# Altium footprint library UWRT_Footprint_Library_2020.PcbLib: 376 footprints (part 13 of 24)
Each footprint in its own frame and in the unit in brackets; x right, y up, seen from the top. Pads: shape width x height; smd on the part's side, far side on the other; paste and mask are expansions set on the pad; w line width, h text height; cw(c..) or ccw(c..) is an arc to the next point about the centre after c.
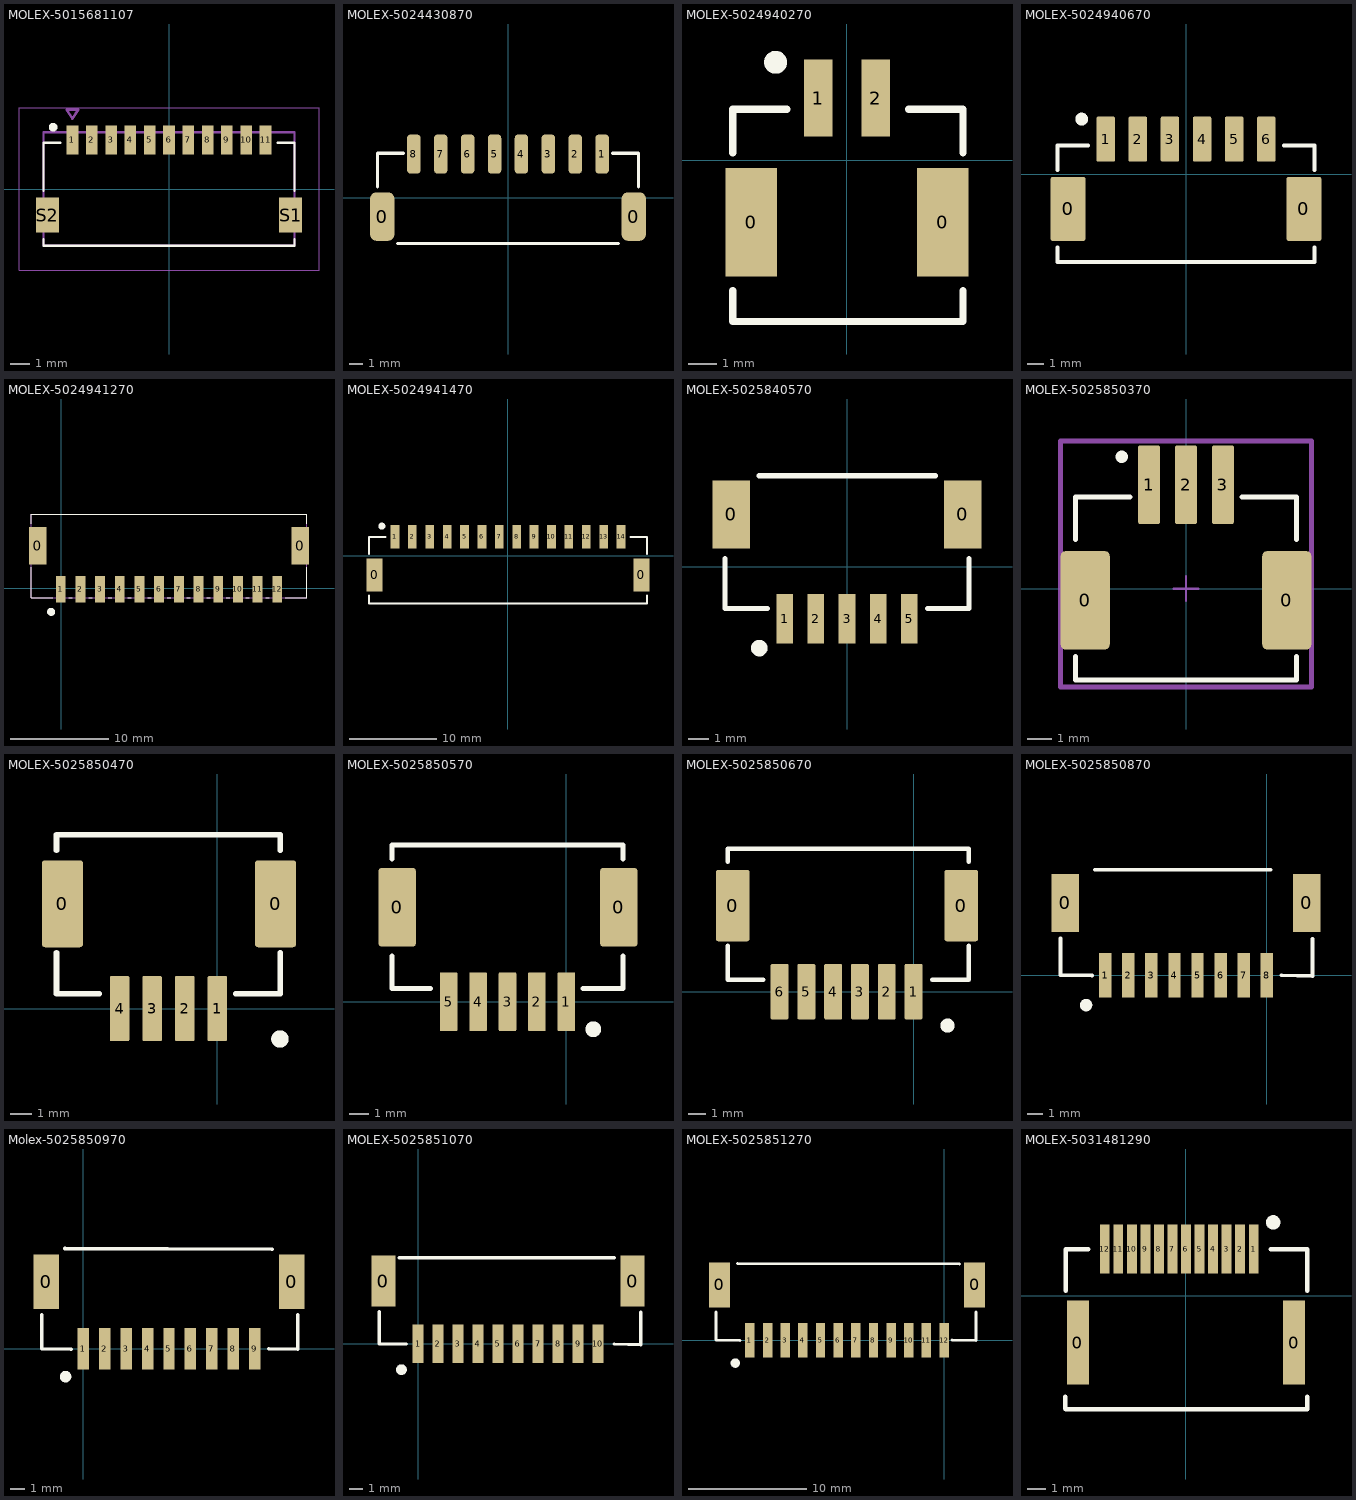
[diagram p12: the footprints below, top view; thin cyan lines are the x and y axes]

## MOLEX-5015681107 [mm]
pads (13):
  rect 0.6x1.5 smd mask+0: 1(-5,2.55) 2(-4,2.55) 3(-3,2.55) 4(-2,2.55) 5(-1,2.55) 6(0,2.55) 7(1,2.55) 8(2,2.55) 9(3,2.55) 10(4,2.55) 11(5,2.55)
  rect 1.2x1.8 smd mask+0: S1(6.3,-1.35) S2(-6.3,-1.35)
Top Overlay:
  circle w0.254: c-6,3.2 r0.1
  lines w0.127: -6.5,-2.6 -6.5,-2.95 6.5,-2.95 6.5,-2.6 ; -6.5,-0.1 -6.5,2.4 -5.62,2.4 ; 5.62,2.4 6.5,2.4 6.5,-0.1
Top Solder:
  region: -3.624,1.724 -4.376,1.724 -4.376,3.376 -3.624,3.376
  region: -4.624,1.724 -5.376,1.724 -5.376,3.376 -4.624,3.376
  region: -5.624,-2.326 -6.976,-2.326 -6.976,-0.374 -5.624,-0.374
  region: 6.976,-2.326 5.624,-2.326 5.624,-0.374 6.976,-0.374
  region: -2.624,1.724 -3.376,1.724 -3.376,3.376 -2.624,3.376
  region: -1.624,1.724 -2.376,1.724 -2.376,3.376 -1.624,3.376
  region: -0.624,1.724 -1.376,1.724 -1.376,3.376 -0.624,3.376
  region: 0.376,1.724 -0.376,1.724 -0.376,3.376 0.376,3.376
  region: 1.376,1.724 0.624,1.724 0.624,3.376 1.376,3.376
  region: 2.376,1.724 1.624,1.724 1.624,3.376 2.376,3.376
  region: 3.376,1.724 2.624,1.724 2.624,3.376 3.376,3.376
  region: 4.376,1.724 3.624,1.724 3.624,3.376 4.376,3.376
  region: 5.376,1.724 4.624,1.724 4.624,3.376 5.376,3.376
Mechanical 13:
  lines w0.127: -6.5,-2.95 6.5,-2.95 6.5,2.95 -6.5,2.95 -6.5,-2.95 ; -5.3,4.1 -4.7,4.1 -5,3.65 -5.3,4.1
Mechanical 15:
  lines w0.05: -7.77,-4.22 -7.77,4.22 7.77,4.22 7.77,-4.22 -7.77,-4.22
3D body "5015681107.stp": height 4.61, standoff -0.09, extent -6.5,-2.975 6.5,2.925

## MOLEX-5024430870 [mm]
pads (10):
  rrect50% 1.8x3.6 smd mask+0: 0(-9.35,-1.4) 0(9.35,-1.4)
  rrect50% 1x2.9 smd mask+0: 1(7,3.25) 2(5,3.25) 3(3,3.25) 4(1,3.25) 5(-1,3.25) 6(-3,3.25) 7(-5,3.25) 8(-7,3.25)
Top Overlay:
  lines w0.254: -9.7,0.8 -9.7,3.3 -7.8,3.3 ; -8.2,-3.4 8.2,-3.4 ; 7.8,3.3 9.7,3.3 9.7,0.8
3D body "5024430870.stp": height 7.43, standoff -0.07, extent -10,-3.7 10,4

## MOLEX-5024940270 [mm] "Molex 5024940670 2 pin 2mm pitch SMD RA connector"
pads (4):
  rect 1.8x3.8 smd: 0(-3.35,-2.175) 0(3.35,-2.175)
  rect 1x2.7 smd: 1(-1,2.175) 2(1,2.175)
Top Overlay:
  circle w0.4: c-2.5,3.425 r0.2
  lines w0.254: -4,-4.572 -4,-5.644 -1.127,-5.644 4.064,-5.644 4.064,-4.572 ; -4,0.254 -4,1.778 -2.096,1.778 ; 2.16,1.778 4.064,1.778 4.064,0.254
3D body "5024940270.stp": height 6.91, standoff 0.01, extent -4,-5.743 4,2.757

## MOLEX-5024940670 [mm] "Molex 5024940670 6 pin 2mm pitch SMD RA connector"
pads (8):
  rrect15% 2.2x4 smd: 0(-7.35,-2.175) 0(7.35,-2.175)
  rrect15% 1.15x2.8 smd: 1(-5,2.175) 2(-3,2.175) 3(-1,2.175) 4(1,2.175) 5(3,2.175) 6(5,2.175)
Top Overlay:
  circle w0.4: c-6.5,3.425 r0.2
  lines w0.254: -8,-4.572 -8,-5.489 -6.858,-5.489 8,-5.489 8,-4.572 ; -8,0.254 -8,1.778 -6.096,1.778 ; 6.096,1.778 8,1.778 8,0.254
3D body "5024940670.stp": height 6.91, standoff 0.01, extent -8,-5.489 8,3.011

## MOLEX-5024941270 [mm]
pads (14):
  rect 1.8x3.8 smd paste+0 mask+0.076: 0(-2.379,4.323) 0(24.321,4.323)
  rect 1x2.7 smd paste+0 mask+0.076: 1(-0.029,-0.127) 2(1.971,-0.127) 3(3.971,-0.127) 4(5.971,-0.127) 5(7.971,-0.127) 6(9.971,-0.127) 7(11.971,-0.127) 8(13.971,-0.127) 9(15.971,-0.127) 10(17.971,-0.127) 11(19.971,-0.127) 12(21.971,-0.127)
Top Overlay:
  circle w0.4: c-1.016,-2.413 r0.2
  lines w0.127: -3.029,2.103 -3.029,-0.977 -0.849,-0.977 ; -3.029,6.543 -3.029,7.523 24.971,7.523 24.971,6.543 ; 0.791,-0.977 1.151,-0.977 ; 2.791,-0.977 3.151,-0.977 ; 4.791,-0.977 5.151,-0.977 ; 6.791,-0.977 7.151,-0.977 ; 8.791,-0.977 9.151,-0.977 ; 10.791,-0.977 11.151,-0.977 ; 12.791,-0.977 13.151,-0.977 ; 14.791,-0.977 15.151,-0.977 ; 16.791,-0.977 17.151,-0.977 ; 18.791,-0.977 19.151,-0.977 ; 20.791,-0.977 21.151,-0.977 ; 22.791,-0.977 24.971,-0.977 24.971,2.103
Mechanical 13:
  lines w0.127: -3.029,-0.977 24.971,-0.977 24.971,7.523 -3.029,7.523 -3.029,-0.977
3D body "5024941270.stp": height 6.76, standoff -0.14, extent -3.002,-0.903 24.998,7.597

## MOLEX-5024941470 [mm] "Molex 5024940670 14 pin 2mm pitch SMD RA connector"
pads (16):
  rect 1.8x3.8 smd: 0(-15.35,-2.175) 0(15.35,-2.175)
  rect 1x2.7 smd: 1(-13,2.175) 2(-11,2.175) 3(-9,2.175) 4(-7,2.175) 5(-5,2.175) 6(-3,2.175) 7(-1,2.175) 8(1,2.175) 9(3,2.175) 10(5,2.175) 11(7,2.175) 12(9,2.175) 13(11,2.175) 14(13,2.175)
Top Overlay:
  circle w0.4: c-14.5,3.425 r0.2
  lines w0.254: -16,-4.572 -16,-5.489 16,-5.489 16,-4.572 ; -16,0.254 -16,2.175 -14.096,2.175 ; 14.096,2.175 16,2.175 16,0.254
3D body "5024941470.stp": height 6.91, standoff 0.01, extent -16,-5.425 16,3.075

## MOLEX-5025840570 [mm] "Molex 5024940670 12 pin 1.5 mm pitch SMD vertical connector"
pads (7):
  rect 1.8x3.3 smd: 0(-5.6,2.525) 0(5.6,2.525)
  rect 0.8x2.4 smd: 1(-3,-2.525) 2(-1.5,-2.525) 3(0,-2.525) 4(1.5,-2.525) 5(3,-2.525)
Top Overlay:
  circle w0.4: c-4.239,-3.937 r0.2
  lines w0.254: -5.9,0.396 -5.9,-2.017 -3.858,-2.017 ; -4.239,4.393 4.27,4.393 ; 3.889,-2.017 5.9,-2.017 5.9,0.396
3D body "5025840570.stp": height 7.31, standoff 0.01, extent -5.9,-3.007 5.9,4.393

## MOLEX-5025850370 [mm]
pads (5):
  rrect20% 2x4 smd paste+0 mask+0: 0(-4.1,-0.475) 0(4.1,-0.475)
  rrect20% 0.9x3.2 smd paste+0 mask+0: 1(-1.5,4.225) 2(0,4.225) 3(1.5,4.225)
Top Overlay:
  circle w0.25: c-2.616,5.359 r0.125
  lines w0.2: -4.5,-2.75 -4.5,-3.725 4.5,-3.725 4.5,-2.75 ; -4.5,2 -4.5,3.725 -2.275,3.725 ; 2.275,3.725 4.5,3.725 4.5,2
Mechanical 12:
  lines w0.15: -4.5,-3.725 4.5,-3.725
Mechanical 15:
  lines w0.1: -0.5,0 0.5,0 ; 0,-0.5 0,0.5
  lines w0.2: -5.1,-3.825 -5.1,6 5.1,6 5.1,-3.825 ; -5.1,5.775 -5.1,-4 5.1,-4 5.1,5.775
3D body "Conn_Molex_502585-0370_eec.STEP": height 6.4, standoff 0, extent -4.4,-3.666 4.4,4.834

## MOLEX-5025850470 [mm] "CLIK-Mate, Surface Mount, Right Angle, 1.5mm pitch"
pads (6):
  rrect15% 1.9x4 smd: 0(-7.125,4.82) 0(2.675,4.82)
  rrect15% 0.9x3 smd: 1(0,0) 2(-1.5,0) 3(-3,0) 4(-4.5,0)
Top Overlay:
  circle w0.4: c2.875,-1.4 r0.2
  lines w0.254: -7.4,2.575 -7.4,0.675 -5.425,0.675 ; -7.4,7.275 -7.4,8 2.9,8 2.9,7.275 ; 0.85,0.675 2.9,0.675 2.9,2.575
3D body "5025850470.stp": height 6.41, standoff 0.01, extent -7.45,-0.62 2.85,7.88

## MOLEX-5025850570 [mm]
pads (7):
  rrect15% 1.9x4 smd: 0(-8.625,4.82) 0(2.675,4.82)
  rrect15% 0.9x3 smd: 1(0,0) 2(-1.5,0) 3(-3,0) 4(-4.5,0) 5(-6,0)
Top Overlay:
  circle w0.4: c1.375,-1.4 r0.2
  lines w0.254: -8.9,2.337 -8.9,0.675 -6.925,0.675 ; -8.9,7.275 -8.9,8 2.9,8 2.9,7.275 ; 0.85,0.675 2.9,0.675 2.9,2.337
3D body "2132260510.stp": height 6.21, standoff -0.19, extent -8.9,-0.5 2.9,8

## MOLEX-5025850670 [mm]
pads (8):
  rrect15% 1.9x4 smd: 0(-10.125,4.82) 0(2.675,4.82)
  rrect15% 1x3.1 smd: 1(0,0) 2(-1.5,0) 3(-3,0) 4(-4.5,0) 5(-6,0) 6(-7.5,0)
Top Overlay:
  circle w0.4: c1.9,-1.9 r0.2
  lines w0.254: -10.4,2.575 -10.4,0.675 -8.425,0.675 ; -10.4,7.275 -10.4,8 3.1,8 3.1,7.275 ; 1.05,0.675 3.1,0.675 3.1,2.575
3D body "5025850670.stp": height 6.41, standoff 0.01, extent -10.25,-0.62 3.05,7.88

## MOLEX-5025850870 [mm]
pads (10):
  rect 1.8x3.8 smd: 0(-13.1,4.7) 0(2.6,4.7)
  rect 0.8x2.9 smd: 1(-10.5,0) 2(-9,0) 3(-7.5,0) 4(-6,0) 5(-4.5,0) 6(-3,0) 7(-1.5,0) 8(0,0)
Top Overlay:
  circle w0.4: c-11.742,-1.94 r0.2
  lines w0.254: -13.403,2.393 -13.403,0 -11.361,-0.02 ; -11.176,6.858 0.254,6.858 ; 0.958,0 2.969,-0.045 ; 2.969,0 2.969,2.368
3D body "5025850870.stp": height 6.41, standoff 0.01, extent -13.23,-1.256 3.07,7.244

## Molex-5025850970 [mm]
pads (11):
  rect 1.8x3.8 smd: 0(-2.6,4.7) 0(14.6,4.7)
  rect 0.8x2.9 smd: 1(0,0) 2(1.5,0) 3(3,0) 4(4.5,0) 5(6,0) 6(7.5,0) 7(9,0) 8(10.5,0) 9(12,0)
Top Overlay:
  circle w0.4: c-1.242,-1.94 r0.2
  lines w0.254: -2.903,2.393 -2.903,0 -0.861,-0.02 ; -1.284,7.03 13.208,6.98 ; 12.989,0.017 15,-0.029 ; 15,0.017 15,2.384
3D body "5025850970.stp": height 5.8, standoff -0.6, extent -2.9,-1.256 14.9,7.244

## MOLEX-5025851070 [mm]
pads (12):
  rect 1.8x3.8 smd: 0(-2.6,4.7) 0(16.1,4.7)
  rect 0.8x2.9 smd: 1(0,0) 2(1.5,0) 3(3,0) 4(4.5,0) 5(6,0) 6(7.5,0) 7(9,0) 8(10.5,0) 9(12,0) 10(13.5,0)
Top Overlay:
  circle w0.4: c-1.242,-1.94 r0.2
  lines w0.254: -2.903,2.393 -2.903,0 -0.861,-0.02 ; -1.422,6.452 14.708,6.45 ; 14.708,-0.02 16.719,-0.065 ; 16.719,-0.02 16.719,2.348
3D body "5025851070.stp": height 6.26, standoff -0.14, extent -2.892,-0.948 16.408,7.552

## MOLEX-5025851270 [mm]
pads (14):
  rect 1.8x3.8 smd: 0(-19.1,4.7) 0(2.6,4.7)
  rect 0.8x2.9 smd: 1(-16.5,0) 2(-15,0) 3(-13.5,0) 4(-12,0) 5(-10.5,0) 6(-9,0) 7(-7.5,0) 8(-6,0) 9(-4.5,0) 10(-3,0) 11(-1.5,0) 12(0,0)
Top Overlay:
  circle w0.4: c-17.742,-1.94 r0.2
  lines w0.254: -19.403,2.393 -19.403,0 -17.361,-0.02 ; -17.577,6.502 1.321,6.477 ; 0.683,0.03 2.694,-0.015 ; 2.694,0.03 2.694,2.398
3D body "5025851270.stp": height 6.41, standoff 0.01, extent -19.354,-1.103 2.946,7.397

## MOLEX-5031481290 [mm] "Molex 5024940670 12 pin 1.5 mm pitch SMD RA connector"
pads (14):
  rect 1.2x4.65 smd: 0(-5.98,-2.587) 0(5.98,-2.587)
  rect 0.55x2.7 smd: 1(3.75,2.588) 2(3,2.588) 3(2.25,2.588) 4(1.5,2.588) 5(0.75,2.588) 6(0,2.588) 7(-0.75,2.588) 8(-1.5,2.588) 9(-2.25,2.588) 10(-3,2.588) 11(-3.75,2.588) 12(-4.5,2.588)
Top Overlay:
  circle w0.4: c4.826,4.064 r0.2
  lines w0.254: -6.676,-5.588 -6.676,-6.254 -6.65,-6.28 6.704,-6.28 6.704,-5.588 ; -6.65,0.28 -6.65,2.588 -5.406,2.588 ; 4.698,2.588 6.704,2.588 6.704,0.28
3D body "5031481290.stp": height 9.21, standoff 0.01, extent -6.65,-6.153 6.65,3.397